# Altium footprint library UP-ROBOT Devices(2013-02-26).PcbLib: 150 footprints (part 10 of 10)
Each footprint in its own frame and in the unit in brackets; x right, y up, seen from the top. Pads: shape width x height; smd on the part's side, far side on the other; paste and mask are expansions set on the pad; w line width, h text height; cw(c..) or ccw(c..) is an arc to the next point about the centre after c.
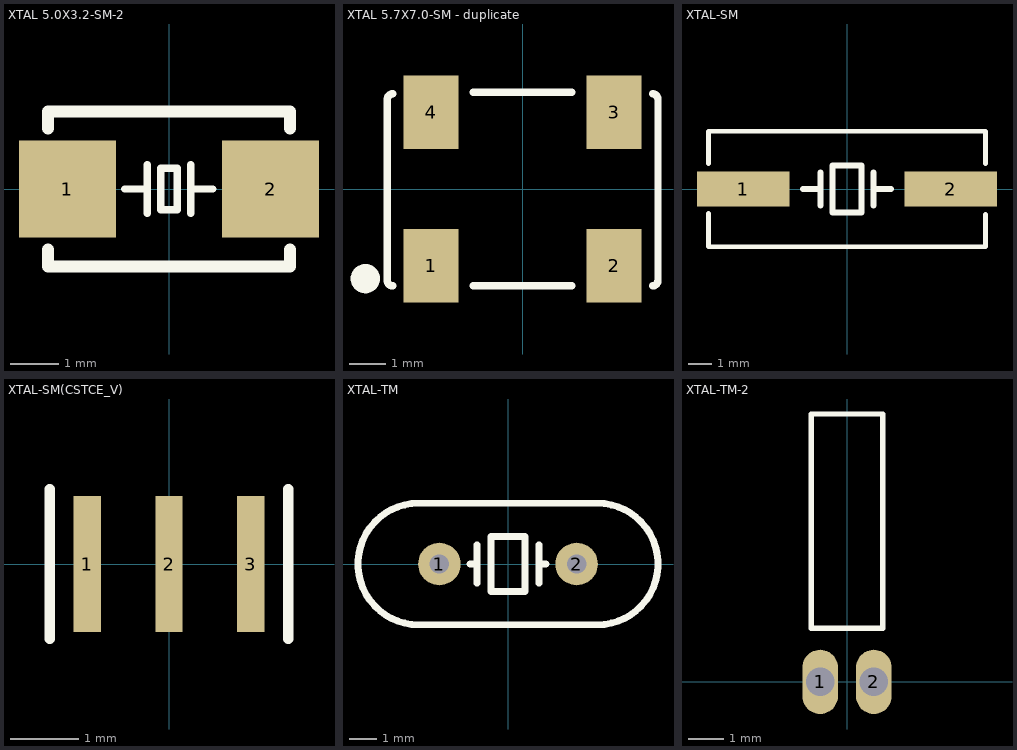
[diagram p9: the footprints below, top view; thin cyan lines are the x and y axes]

## XTAL 5.0X3.2-SM-2 [mm]
pads (2):
  rect 2x2 smd: 1(-2.1,0) 2(2.1,0)
Top Overlay:
  lines w0.15: -0.92,0 -0.46,0 ; -0.45,-0.5 -0.45,0.5 ; 0.45,-0.5 0.45,0.5 ; 0.45,0 0.91,0 ; -0.17,-0.43 0.17,-0.43 0.17,0.43 -0.17,0.43 -0.17,-0.43
  lines w0.254: -2.5,-1.25 -2.5,-1.6 2.5,-1.6 2.5,-1.25 ; -2.5,1.25 -2.5,1.6 2.5,1.6 2.5,1.25

## XTAL 5.7X7.0-SM - duplicate [mm]
pads (4):
  rect 1.5x2 smd: 1(-2.5,-2.1) 2(2.5,-2.1) 3(2.5,2.1) 4(-2.5,2.1)
Top Overlay:
  circle w0.4: c-4.3,-2.45 r0.2
  lines w0.203: -3.55,-2.65 cw(c-3.55,-2.5) -3.7,-2.5 -3.7,-0.05 -3.7,2.45 cw(c-3.55,2.45) -3.55,2.6 ; -1.35,-2.65 1.35,-2.65 ; -1.35,2.65 1.35,2.65 ; 3.55,-2.65 ccw(c3.55,-2.5) 3.7,-2.5 3.7,0 3.7,2.45 ccw(c3.55,2.45) 3.55,2.6
3D body: height 1.5, standoff 0, extent -3.55,-2.55 3.45,2.45

## XTAL-SM [mm]
pads (2):
  rect 4x1.5 smd: 1(-4.5,0) 2(4.5,0)
Top Overlay:
  lines w0.203: -6,-2.5 -6,-1.05 ; -6,1.1 -6,2.5 6,2.5 6,1.6 ; -5.95,-2.5 6,-2.5 6,-1.1 ; 6,1.1 6,1.62
  lines w0.254: -1.9,0 -1.143,0 ; -1.143,-0.711 -1.143,0.711 ; 1.143,-0.711 1.143,0.711 ; 1.143,0 1.9,0 ; -0.635,-1.016 -0.635,1.016 0.635,1.016 0.635,-1.016 -0.635,-1.016
3D body: height 3.85, standoff -0.18, extent -5.75,-2.45 5.75,2.35

## XTAL-SM(CSTCE_V) [mm] "muRata's resonator use in UP-RobotServo"
pads (3):
  rect 0.4x2 smd: 1(-1.2,0) 2(0,0) 3(1.2,0)
Top Overlay:
  lines w0.152: -1.75,-1.1 -1.75,1.1 ; 1.75,-1.1 1.75,1.1
3D body: height 0.7, standoff 0, extent -1.6,-0.6 1.6,0.7

## XTAL-TM [mil]
pads (2):
  round 62 hole 28: 1(-100,0) 2(100,0)
Top Overlay:
  lines w10: -55.12,0 -45,0 ; -45,-28 -45,28 ; 45,-28 45,28 ; 45,0 55.12,0 ; -129.92,-88.58 cw(c-129.92,0) -129.92,88.58 129.92,88.58 cw(c129.92,0) 129.92,-88.58 -129.92,-88.58 ; -25,-40 -25,40 25,40 25,-40 -25,-40
3D body: height 132, standoff -39.37, extent -216.54,-90.55 219.46,85.45

## XTAL-TM-2 [mm]
pads (2):
  oval 1x1.8 hole 0.8: 1(-0.75,0) 2(0.75,0)
Top Overlay:
  lines w0.152: -1,1.5 1,1.5 1,7.5 -1,7.5 -1,1.5